# Altium schematic symbol library Resistor - Current Sense.SchLib: 810 symbols (part 4 of 4) (continued)
## WSL2512R0330FEA (continued)
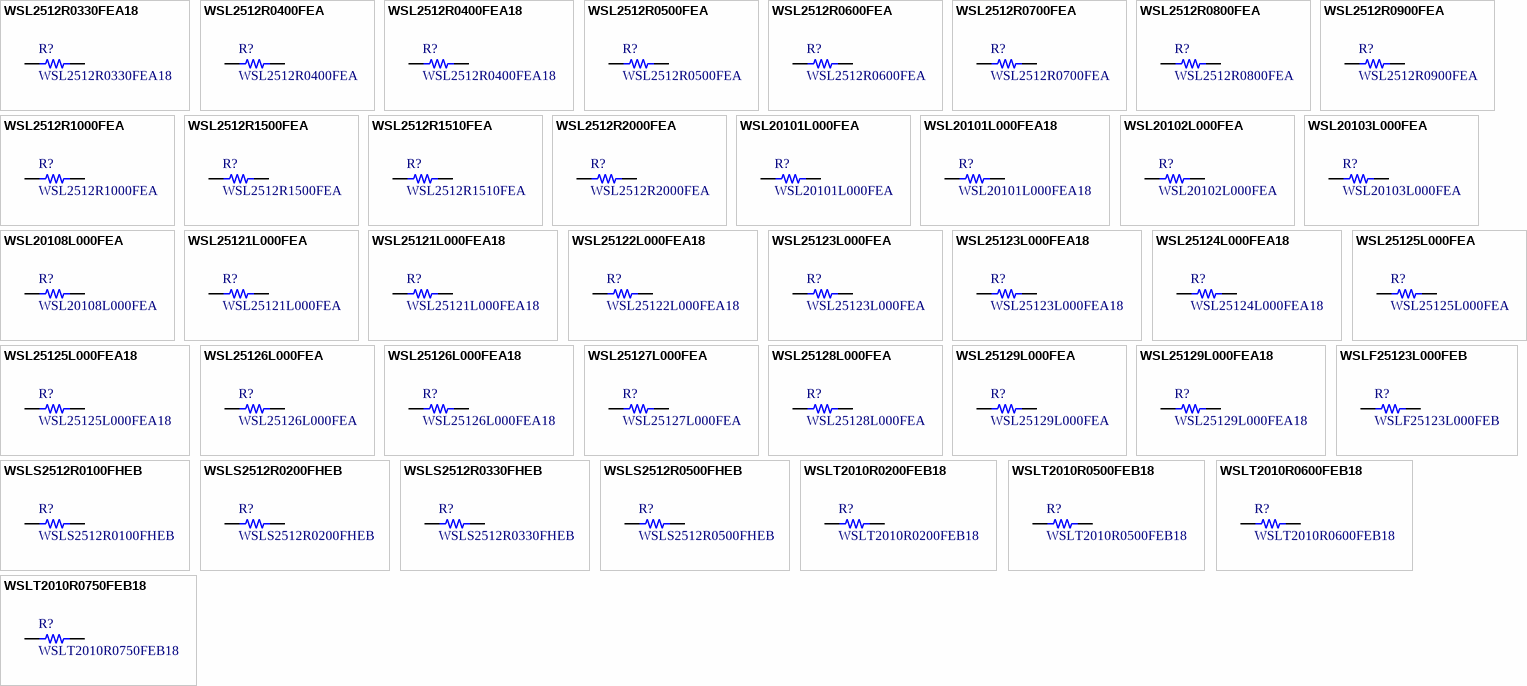
[diagram p19: symbols WSL2512R0330FEA18 to WSLT2010R0750FEB18]

## WSL2512R0330FEA18
designator R?
RES SMD 0.033 OHM 1% 2W 2512; Manufacturer: Vishay Dale; Value: 0.033; TemperatureRange: -65C ~ 170C; TemperatureCoefficient: 75ppm/C; Part Number: WSL2512R0330FEA18; PartId: 21499; Supplier 1: Digi-Key; Supplier Part Number 1: WSLH-.033TR-ND; ComponentLink1Description: Datasheet; ComponentLink1URL: http://www.vishay.com/docs/31057/wslhigh.pdf; ComponentLink2Description: Digi-Key Listing; ComponentLink2URL: https://www.digikey.com/product-detail/en/vishay-dale/WSL2512R0330FEA18/WSLH-.033TR-ND/2695064; Tolerance: 1%; PowerRating: 2W; Price: 0.572; Device Package: 2512 (6432 Metric)
footprint STACKPOLE CSR2512
pins: 1, 2

## WSL2512R0400FEA
designator R?
RES SMD 0.04 OHM 1% 1W 2512; Manufacturer: Vishay Dale; Value: 0.04; TemperatureRange: -65C ~ 170C; TemperatureCoefficient: 75ppm/C; Part Number: WSL2512R0400FEA; PartId: 21478; Supplier 1: Digi-Key; Supplier Part Number 1: WSLG-.04TR-ND; ComponentLink1Description: Datasheet; ComponentLink1URL: http://www.vishay.com/docs/30100/wsl.pdf; ComponentLink2Description: Digi-Key Listing; ComponentLink2URL: https://www.digikey.com/product-detail/en/vishay-dale/WSL2512R0400FEA/WSLG-.04TR-ND/712567; Tolerance: 1%; PowerRating: 1W; Price: 0.442; Device Package: 2512 (6432 Metric)
footprint STACKPOLE CSR2512
pins: 1, 2

## WSL2512R0400FEA18
designator R?
RES SMD 0.04 OHM 1% 2W 2512; Manufacturer: Vishay Dale; Value: 0.04; TemperatureRange: -65C ~ 170C; TemperatureCoefficient: 75ppm/C; Part Number: WSL2512R0400FEA18; PartId: 21496; Supplier 1: Digi-Key; Supplier Part Number 1: WSLH-.04TR-ND; ComponentLink1Description: Datasheet; ComponentLink1URL: http://www.vishay.com/docs/31057/wslhigh.pdf; ComponentLink2Description: Digi-Key Listing; ComponentLink2URL: https://www.digikey.com/product-detail/en/vishay-dale/WSL2512R0400FEA18/WSLH-.04TR-ND/2695066; Tolerance: 1%; PowerRating: 2W; Price: 0.572; Device Package: 2512 (6432 Metric)
footprint STACKPOLE CSR2512
pins: 1, 2

## WSL2512R0500FEA
designator R?
RES SMD 0.05 OHM 1% 1W 2512; Manufacturer: Vishay Dale; Value: 0.05; TemperatureRange: -65C ~ 170C; TemperatureCoefficient: 75ppm/C; Part Number: WSL2512R0500FEA; PartId: 21473; Supplier 1: Digi-Key; Supplier Part Number 1: WSLG-.05TR-ND; ComponentLink1Description: Datasheet; ComponentLink1URL: http://www.vishay.com/docs/30100/wsl.pdf; ComponentLink2Description: Digi-Key Listing; ComponentLink2URL: https://www.digikey.com/product-detail/en/vishay-dale/WSL2512R0500FEA/WSLG-.05TR-ND/712568; Tolerance: 1%; PowerRating: 1W; Price: 0.442; Device Package: 2512 (6432 Metric)
footprint STACKPOLE CSR2512
pins: 1, 2

## WSL2512R0600FEA
designator R?
RES SMD 0.06 OHM 1% 1W 2512; Manufacturer: Vishay Dale; Value: 0.06; TemperatureRange: -65C ~ 170C; TemperatureCoefficient: 75ppm/C; Part Number: WSL2512R0600FEA; PartId: 21476; Supplier 1: Digi-Key; Supplier Part Number 1: WSLG-.06TR-ND; ComponentLink1Description: Datasheet; ComponentLink1URL: http://www.vishay.com/docs/30100/wsl.pdf; ComponentLink2Description: Digi-Key Listing; ComponentLink2URL: https://www.digikey.com/product-detail/en/vishay-dale/WSL2512R0600FEA/WSLG-.06TR-ND/712569; Tolerance: 1%; PowerRating: 1W; Price: 0.442; Device Package: 2512 (6432 Metric)
footprint STACKPOLE CSR2512
pins: 1, 2

## WSL2512R0700FEA
designator R?
RES SMD 0.07 OHM 1% 1W 2512; Manufacturer: Vishay Dale; Value: 0.07; TemperatureRange: -65C ~ 170C; TemperatureCoefficient: 75ppm/C; Part Number: WSL2512R0700FEA; PartId: 21468; Supplier 1: Digi-Key; Supplier Part Number 1: WSLG-.07TR-ND; ComponentLink1Description: Datasheet; ComponentLink1URL: http://www.vishay.com/docs/30100/wsl.pdf; ComponentLink2Description: Digi-Key Listing; ComponentLink2URL: https://www.digikey.com/product-detail/en/vishay-dale/WSL2512R0700FEA/WSLG-.07TR-ND/712570; Tolerance: 1%; PowerRating: 1W; Price: 0.39; Device Package: 2512 (6432 Metric)
footprint STACKPOLE CSR2512
pins: 1, 2

## WSL2512R0800FEA
designator R?
RES SMD 0.08 OHM 1% 1W 2512; Manufacturer: Vishay Dale; Value: 0.08; TemperatureRange: -65C ~ 170C; TemperatureCoefficient: 75ppm/C; Part Number: WSL2512R0800FEA; PartId: 21465; Supplier 1: Digi-Key; Supplier Part Number 1: WSLG-.08TR-ND; ComponentLink1Description: Datasheet; ComponentLink1URL: http://www.vishay.com/docs/30100/wsl.pdf; ComponentLink2Description: Digi-Key Listing; ComponentLink2URL: https://www.digikey.com/product-detail/en/vishay-dale/WSL2512R0800FEA/WSLG-.08TR-ND/712571; Tolerance: 1%; PowerRating: 1W; Price: 0.39; Device Package: 2512 (6432 Metric)
footprint STACKPOLE CSR2512
pins: 1, 2

## WSL2512R0900FEA
designator R?
RES SMD 0.09 OHM 1% 1W 2512; Manufacturer: Vishay Dale; Value: 0.09; TemperatureRange: -65C ~ 170C; TemperatureCoefficient: 75ppm/C; Part Number: WSL2512R0900FEA; PartId: 21466; Supplier 1: Digi-Key; Supplier Part Number 1: WSLG-.09TR-ND; ComponentLink1Description: Datasheet; ComponentLink1URL: http://www.vishay.com/docs/30100/wsl.pdf; ComponentLink2Description: Digi-Key Listing; ComponentLink2URL: https://www.digikey.com/product-detail/en/vishay-dale/WSL2512R0900FEA/WSLG-.09TR-ND/712572; Tolerance: 1%; PowerRating: 1W; Price: 0.39; Device Package: 2512 (6432 Metric)
footprint STACKPOLE CSR2512
pins: 1, 2

## WSL2512R1000FEA
designator R?
RES SMD 0.1 OHM 1% 1W 2512; Manufacturer: Vishay Dale; Value: 0.1; TemperatureRange: -65C ~ 170C; TemperatureCoefficient: 75ppm/C; Part Number: WSL2512R1000FEA; PartId: 21462; Supplier 1: Digi-Key; Supplier Part Number 1: WSLG-.10TR-ND; ComponentLink1Description: Datasheet; ComponentLink1URL: http://www.vishay.com/docs/30100/wsl.pdf; ComponentLink2Description: Digi-Key Listing; ComponentLink2URL: https://www.digikey.com/product-detail/en/vishay-dale/WSL2512R1000FEA/WSLG-.10TR-ND/712573; Tolerance: 1%; PowerRating: 1W; Price: 0.39; Device Package: 2512 (6432 Metric)
footprint STACKPOLE CSR2512
pins: 1, 2

## WSL2512R1500FEA
designator R?
RES SMD 0.15 OHM 1% 1W 2512; Manufacturer: Vishay Dale; Value: 0.15; TemperatureRange: -65C ~ 170C; TemperatureCoefficient: 75ppm/C; Part Number: WSL2512R1500FEA; PartId: 21464; Supplier 1: Digi-Key; Supplier Part Number 1: WSLG-.15TR-ND; ComponentLink1Description: Datasheet; ComponentLink1URL: http://www.vishay.com/docs/30100/wsl.pdf; ComponentLink2Description: Digi-Key Listing; ComponentLink2URL: https://www.digikey.com/product-detail/en/vishay-dale/WSL2512R1500FEA/WSLG-.15TR-ND/712574; Tolerance: 1%; PowerRating: 1W; Price: 0.39; Device Package: 2512 (6432 Metric)
footprint STACKPOLE CSR2512
pins: 1, 2

## WSL2512R1510FEA
designator R?
RES SMD 0.151 OHM 1% 1W 2512; Manufacturer: Vishay Dale; Value: 0.151; TemperatureRange: -65C ~ 170C; TemperatureCoefficient: 75ppm/C; Part Number: WSL2512R1510FEA; PartId: 21452; Supplier 1: Digi-Key; Supplier Part Number 1: WSLG-.151TR-ND; ComponentLink1Description: Datasheet; ComponentLink1URL: http://www.vishay.com/docs/30100/wsl.pdf; ComponentLink2Description: Digi-Key Listing; ComponentLink2URL: https://www.digikey.com/product-detail/en/vishay-dale/WSL2512R1510FEA/WSLG-.151TR-ND/712575; Tolerance: 1%; PowerRating: 1W; Price: 0.2893; Device Package: 2512 (6432 Metric)
footprint STACKPOLE CSR2512
pins: 1, 2

## WSL2512R2000FEA
designator R?
RES SMD 0.2 OHM 1% 1W 2512; Manufacturer: Vishay Dale; Value: 0.2; TemperatureRange: -65C ~ 170C; TemperatureCoefficient: 75ppm/C; Part Number: WSL2512R2000FEA; PartId: 21463; Supplier 1: Digi-Key; Supplier Part Number 1: WSLG-.20TR-ND; ComponentLink1Description: Datasheet; ComponentLink1URL: http://www.vishay.com/docs/30100/wsl.pdf; ComponentLink2Description: Digi-Key Listing; ComponentLink2URL: https://www.digikey.com/product-detail/en/vishay-dale/WSL2512R2000FEA/WSLG-.20TR-ND/712576; Tolerance: 1%; PowerRating: 1W; Price: 0.39; Device Package: 2512 (6432 Metric)
footprint STACKPOLE CSR2512
pins: 1, 2

## WSL20101L000FEA
designator R?
RES SMD 0.001 OHM 1% 1/2W 2010; Manufacturer: Vishay Dale; Value: 0.001; TemperatureRange: -65C ~ 170C; TemperatureCoefficient: 275ppm/C; PowerRating: 0.5W, 1/2W; Part Number: WSL20101L000FEA; PartId: 21606; Supplier 1: Digi-Key; Supplier Part Number 1: WSLE-.001TR-ND; ComponentLink1Description: Datasheet; ComponentLink1URL: http://www.vishay.com/docs/30100/wsl.pdf; ComponentLink2Description: Digi-Key Listing; ComponentLink2URL: https://www.digikey.com/product-detail/en/vishay-dale/WSL20101L000FEA/WSLE-.001TR-ND/712504; Tolerance: 1%; Price: 0.494; Device Package: 2010 (5025 Metric)
footprint STACKPOLE CSR2010
pins: 1, 2

## WSL20101L000FEA18
designator R?
RES SMD 0.001 OHM 1% 1W 2010; Manufacturer: Vishay Dale; Value: 0.001; TemperatureRange: -65C ~ 170C; TemperatureCoefficient: 275ppm/C; Part Number: WSL20101L000FEA18; PartId: 21610; Supplier 1: Digi-Key; Supplier Part Number 1: WSLF-.001TR-ND; ComponentLink1Description: Datasheet; ComponentLink1URL: http://www.vishay.com/docs/31057/wslhigh.pdf; ComponentLink2Description: Digi-Key Listing; ComponentLink2URL: https://www.digikey.com/product-detail/en/vishay-dale/WSL20101L000FEA18/WSLF-.001TR-ND/712505; Tolerance: 1%; PowerRating: 1W; Price: 0.6435; Device Package: 2010 (5025 Metric)
footprint STACKPOLE CSR2010
pins: 1, 2

## WSL20102L000FEA
designator R?
RES SMD 0.002 OHM 1% 1/2W 2010; Manufacturer: Vishay Dale; Value: 0.002; TemperatureRange: -65C ~ 170C; TemperatureCoefficient: 275ppm/C; PowerRating: 0.5W, 1/2W; Part Number: WSL20102L000FEA; PartId: 21607; Supplier 1: Digi-Key; Supplier Part Number 1: WSLE-.002TR-ND; ComponentLink1Description: Datasheet; ComponentLink1URL: http://www.vishay.com/docs/30100/wsl.pdf; ComponentLink2Description: Digi-Key Listing; ComponentLink2URL: https://www.digikey.com/product-detail/en/vishay-dale/WSL20102L000FEA/WSLE-.002TR-ND/712506; Tolerance: 1%; Price: 0.494; Device Package: 2010 (5025 Metric)
footprint STACKPOLE CSR2010
pins: 1, 2

## WSL20103L000FEA
designator R?
RES SMD 0.003 OHM 1% 1/2W 2010; Manufacturer: Vishay Dale; Value: 0.003; TemperatureRange: -65C ~ 170C; TemperatureCoefficient: 150ppm/C; PowerRating: 0.5W, 1/2W; Part Number: WSL20103L000FEA; PartId: 21608; Supplier 1: Digi-Key; Supplier Part Number 1: WSLE-.003TR-ND; ComponentLink1Description: Datasheet; ComponentLink1URL: http://www.vishay.com/docs/30100/wsl.pdf; ComponentLink2Description: Digi-Key Listing; ComponentLink2URL: https://www.digikey.com/product-detail/en/vishay-dale/WSL20103L000FEA/WSLE-.003TR-ND/712507; Tolerance: 1%; Price: 0.494; Device Package: 2010 (5025 Metric)
footprint STACKPOLE CSR2010
pins: 1, 2

## WSL20108L000FEA
designator R?
RES SMD 0.008 OHM 1% 1/2W 2010; Manufacturer: Vishay Dale; Value: 0.008; TemperatureRange: -65C ~ 170C; TemperatureCoefficient: 75ppm/C; PowerRating: 0.5W, 1/2W; Part Number: WSL20108L000FEA; PartId: 21605; Supplier 1: Digi-Key; Supplier Part Number 1: WSLE-.008TR-ND; ComponentLink1Description: Datasheet; ComponentLink1URL: http://www.vishay.com/docs/30100/wsl.pdf; ComponentLink2Description: Digi-Key Listing; ComponentLink2URL: https://www.digikey.com/product-detail/en/vishay-dale/WSL20108L000FEA/WSLE-.008TR-ND/712514; Tolerance: 1%; Price: 0.468; Device Package: 2010 (5025 Metric)
footprint STACKPOLE CSR2010
pins: 1, 2

## WSL25121L000FEA
designator R?
RES SMD 0.001 OHM 1% 1W 2512; Manufacturer: Vishay Dale; Value: 0.001; TemperatureRange: -65C ~ 170C; TemperatureCoefficient: 275ppm/C; Part Number: WSL25121L000FEA; PartId: 21510; Supplier 1: Digi-Key; Supplier Part Number 1: WSLG-.001TR-ND; ComponentLink1Description: Datasheet; ComponentLink1URL: http://www.vishay.com/docs/30100/wsl.pdf; ComponentLink2Description: Digi-Key Listing; ComponentLink2URL: https://www.digikey.com/product-detail/en/vishay-dale/WSL25121L000FEA/WSLG-.001TR-ND/712551; Tolerance: 1%; PowerRating: 1W; Price: 0.663; Device Package: 2512 (6432 Metric)
footprint STACKPOLE CSR2512
pins: 1, 2

## WSL25121L000FEA18
designator R?
RES SMD 0.001 OHM 1% 2W 2512; Manufacturer: Vishay Dale; Value: 0.001; TemperatureRange: -65C ~ 170C; TemperatureCoefficient: 275ppm/C; Part Number: WSL25121L000FEA18; PartId: 21517; Supplier 1: Digi-Key; Supplier Part Number 1: WSLH-.001TR-ND; ComponentLink1Description: Datasheet; ComponentLink1URL: http://www.vishay.com/docs/31057/wslhigh.pdf; ComponentLink2Description: Digi-Key Listing; ComponentLink2URL: https://www.digikey.com/product-detail/en/vishay-dale/WSL25121L000FEA18/WSLH-.001TR-ND/2695039; Tolerance: 1%; PowerRating: 2W; Price: 0.8606; Device Package: 2512 (6432 Metric)
footprint STACKPOLE CSR2512
pins: 1, 2

## WSL25122L000FEA18
designator R?
RES SMD 0.002 OHM 1% 2W 2512; Manufacturer: Vishay Dale; Value: 0.002; TemperatureRange: -65C ~ 170C; TemperatureCoefficient: 275ppm/C; Part Number: WSL25122L000FEA18; PartId: 21514; Supplier 1: Digi-Key; Supplier Part Number 1: WSLH-.002TR-ND; ComponentLink1Description: Datasheet; ComponentLink1URL: http://www.vishay.com/docs/31057/wslhigh.pdf; ComponentLink2Description: Digi-Key Listing; ComponentLink2URL: https://www.digikey.com/product-detail/en/vishay-dale/WSL25122L000FEA18/WSLH-.002TR-ND/2695040; Tolerance: 1%; PowerRating: 2W; Price: 0.8606; Device Package: 2512 (6432 Metric)
footprint STACKPOLE CSR2512
pins: 1, 2

## WSL25123L000FEA
designator R?
RES SMD 0.003 OHM 1% 1W 2512; Manufacturer: Vishay Dale; Value: 0.003; TemperatureRange: -65C ~ 170C; TemperatureCoefficient: 150ppm/C; Part Number: WSL25123L000FEA; PartId: 21509; Supplier 1: Digi-Key; Supplier Part Number 1: WSLG-.003TR-ND; ComponentLink1Description: Datasheet; ComponentLink1URL: http://www.vishay.com/docs/30100/wsl.pdf; ComponentLink2Description: Digi-Key Listing; ComponentLink2URL: https://www.digikey.com/product-detail/en/vishay-dale/WSL25123L000FEA/WSLG-.003TR-ND/712553; Tolerance: 1%; PowerRating: 1W; Price: 0.663; Device Package: 2512 (6432 Metric)
footprint STACKPOLE CSR2512
pins: 1, 2

## WSL25123L000FEA18
designator R?
RES SMD 0.003 OHM 1% 2W 2512; Manufacturer: Vishay Dale; Value: 0.003; TemperatureRange: -65C ~ 170C; TemperatureCoefficient: 150ppm/C; Part Number: WSL25123L000FEA18; PartId: 21515; Supplier 1: Digi-Key; Supplier Part Number 1: WSLH-.003TR-ND; ComponentLink1Description: Datasheet; ComponentLink1URL: http://www.vishay.com/docs/31057/wslhigh.pdf; ComponentLink2Description: Digi-Key Listing; ComponentLink2URL: https://www.digikey.com/product-detail/en/vishay-dale/WSL25123L000FEA18/WSLH-.003TR-ND/2695041; Tolerance: 1%; PowerRating: 2W; Price: 0.8606; Device Package: 2512 (6432 Metric)
footprint STACKPOLE CSR2512
pins: 1, 2

## WSL25124L000FEA18
designator R?
RES SMD 0.004 OHM 1% 2W 2512; Manufacturer: Vishay Dale; Value: 0.004; TemperatureRange: -65C ~ 170C; TemperatureCoefficient: 150ppm/C; Part Number: WSL25124L000FEA18; PartId: 21516; Supplier 1: Digi-Key; Supplier Part Number 1: WSLH-.004TR-ND; ComponentLink1Description: Datasheet; ComponentLink1URL: http://www.vishay.com/docs/31057/wslhigh.pdf; ComponentLink2Description: Digi-Key Listing; ComponentLink2URL: https://www.digikey.com/product-detail/en/vishay-dale/WSL25124L000FEA18/WSLH-.004TR-ND/2695042; Tolerance: 1%; PowerRating: 2W; Price: 0.8606; Device Package: 2512 (6432 Metric)
footprint STACKPOLE CSR2512
pins: 1, 2

## WSL25125L000FEA
designator R?
RES SMD 0.005 OHM 1% 1W 2512; Manufacturer: Vishay Dale; Value: 0.005; TemperatureRange: -65C ~ 170C; TemperatureCoefficient: 110ppm/C; Part Number: WSL25125L000FEA; PartId: 21501; Supplier 1: Digi-Key; Supplier Part Number 1: WSLG-.005TR-ND; ComponentLink1Description: Datasheet; ComponentLink1URL: http://www.vishay.com/docs/30100/wsl.pdf; ComponentLink2Description: Digi-Key Listing; ComponentLink2URL: https://www.digikey.com/product-detail/en/vishay-dale/WSL25125L000FEA/WSLG-.005TR-ND/712555; Tolerance: 1%; PowerRating: 1W; Price: 0.6375; Device Package: 2512 (6432 Metric)
footprint STACKPOLE CSR2512
pins: 1, 2

## WSL25125L000FEA18
designator R?
RES SMD 0.005 OHM 1% 2W 2512; Manufacturer: Vishay Dale; Value: 0.005; TemperatureRange: -65C ~ 170C; TemperatureCoefficient: 110ppm/C; Part Number: WSL25125L000FEA18; PartId: 21512; Supplier 1: Digi-Key; Supplier Part Number 1: WSLH-.005TR-ND; ComponentLink1Description: Datasheet; ComponentLink1URL: http://www.vishay.com/docs/31057/wslhigh.pdf; ComponentLink2Description: Digi-Key Listing; ComponentLink2URL: https://www.digikey.com/product-detail/en/vishay-dale/WSL25125L000FEA18/WSLH-.005TR-ND/2695043; Tolerance: 1%; PowerRating: 2W; Price: 0.8287; Device Package: 2512 (6432 Metric)
footprint STACKPOLE CSR2512
pins: 1, 2

## WSL25126L000FEA
designator R?
RES SMD 0.006 OHM 1% 1W 2512; Manufacturer: Vishay Dale; Value: 0.006; TemperatureRange: -65C ~ 170C; TemperatureCoefficient: 110ppm/C; Part Number: WSL25126L000FEA; PartId: 21500; Supplier 1: Digi-Key; Supplier Part Number 1: WSLG-.006TR-ND; ComponentLink1Description: Datasheet; ComponentLink1URL: http://www.vishay.com/docs/30100/wsl.pdf; ComponentLink2Description: Digi-Key Listing; ComponentLink2URL: https://www.digikey.com/product-detail/en/vishay-dale/WSL25126L000FEA/WSLG-.006TR-ND/712556; Tolerance: 1%; PowerRating: 1W; Price: 0.6375; Device Package: 2512 (6432 Metric)
footprint STACKPOLE CSR2512
pins: 1, 2

## WSL25126L000FEA18
designator R?
RES SMD 0.006 OHM 1% 2W 2512; Manufacturer: Vishay Dale; Value: 0.006; TemperatureRange: -65C ~ 170C; TemperatureCoefficient: 110ppm/C; Part Number: WSL25126L000FEA18; PartId: 21513; Supplier 1: Digi-Key; Supplier Part Number 1: WSLH-.006TR-ND; ComponentLink1Description: Datasheet; ComponentLink1URL: http://www.vishay.com/docs/31057/wslhigh.pdf; ComponentLink2Description: Digi-Key Listing; ComponentLink2URL: https://www.digikey.com/product-detail/en/vishay-dale/WSL25126L000FEA18/WSLH-.006TR-ND/2695044; Tolerance: 1%; PowerRating: 2W; Price: 0.8287; Device Package: 2512 (6432 Metric)
footprint STACKPOLE CSR2512
pins: 1, 2

## WSL25127L000FEA
designator R?
RES SMD 0.007 OHM 1% 1W 2512; Manufacturer: Vishay Dale; Value: 0.007; TemperatureRange: -65C ~ 170C; TemperatureCoefficient: 75ppm/C; Part Number: WSL25127L000FEA; PartId: 21502; Supplier 1: Digi-Key; Supplier Part Number 1: WSLG-.007TR-ND; ComponentLink1Description: Datasheet; ComponentLink1URL: http://www.vishay.com/docs/30100/wsl.pdf; ComponentLink2Description: Digi-Key Listing; ComponentLink2URL: https://www.digikey.com/product-detail/en/vishay-dale/WSL25127L000FEA/WSLG-.007TR-ND/712557; Tolerance: 1%; PowerRating: 1W; Price: 0.6375; Device Package: 2512 (6432 Metric)
footprint STACKPOLE CSR2512
pins: 1, 2

## WSL25128L000FEA
designator R?
RES SMD 0.008 OHM 1% 1W 2512; Manufacturer: Vishay Dale; Value: 0.008; TemperatureRange: -65C ~ 170C; TemperatureCoefficient: 75ppm/C; Part Number: WSL25128L000FEA; PartId: 21504; Supplier 1: Digi-Key; Supplier Part Number 1: WSLG-.008TR-ND; ComponentLink1Description: Datasheet; ComponentLink1URL: http://www.vishay.com/docs/30100/wsl.pdf; ComponentLink2Description: Digi-Key Listing; ComponentLink2URL: https://www.digikey.com/product-detail/en/vishay-dale/WSL25128L000FEA/WSLG-.008TR-ND/712558; Tolerance: 1%; PowerRating: 1W; Price: 0.6375; Device Package: 2512 (6432 Metric)
footprint STACKPOLE CSR2512
pins: 1, 2

## WSL25129L000FEA
designator R?
RES SMD 0.009 OHM 1% 1W 2512; Manufacturer: Vishay Dale; Value: 0.009; TemperatureRange: -65C ~ 170C; TemperatureCoefficient: 75ppm/C; Part Number: WSL25129L000FEA; PartId: 21503; Supplier 1: Digi-Key; Supplier Part Number 1: WSLG-.009TR-ND; ComponentLink1Description: Datasheet; ComponentLink1URL: http://www.vishay.com/docs/30100/wsl.pdf; ComponentLink2Description: Digi-Key Listing; ComponentLink2URL: https://www.digikey.com/product-detail/en/vishay-dale/WSL25129L000FEA/WSLG-.009TR-ND/712559; Tolerance: 1%; PowerRating: 1W; Price: 0.6375; Device Package: 2512 (6432 Metric)
footprint STACKPOLE CSR2512
pins: 1, 2

## WSL25129L000FEA18
designator R?
RES SMD 0.009 OHM 1% 2W 2512; Manufacturer: Vishay Dale; Value: 0.009; TemperatureRange: -65C ~ 170C; TemperatureCoefficient: 75ppm/C; Part Number: WSL25129L000FEA18; PartId: 21511; Supplier 1: Digi-Key; Supplier Part Number 1: WSLH-.009TR-ND; ComponentLink1Description: Datasheet; ComponentLink1URL: http://www.vishay.com/docs/31057/wslhigh.pdf; ComponentLink2Description: Digi-Key Listing; ComponentLink2URL: https://www.digikey.com/product-detail/en/vishay-dale/WSL25129L000FEA18/WSLH-.009TR-ND/712560; Tolerance: 1%; PowerRating: 2W; Price: 0.8287; Device Package: 2512 (6432 Metric)
footprint STACKPOLE CSR2512
pins: 1, 2

## WSLF25123L000FEB
designator R?
RES SMD 0.003 OHM 1% 4W 2512; Manufacturer: Vishay Dale; Value: 0.003; TemperatureRange: -65C ~ 170C; TemperatureCoefficient: 70ppm/C; Part Number: WSLF25123L000FEB; PartId: 21446; Supplier 1: Digi-Key; Supplier Part Number 1: 541-3132-2-ND; ComponentLink1Description: Datasheet; ComponentLink1URL: http://www.vishay.com/docs/30193/wslf.pdf; ComponentLink2Description: Digi-Key Listing; ComponentLink2URL: https://www.digikey.com/product-detail/en/vishay-dale/WSLF25123L000FEB/541-3132-2-ND/6194695; Tolerance: 1%; PowerRating: 4W; Price: 0.2835; Device Package: 2512 (6432 Metric)
footprint STACKPOLE CSR2512
pins: 1, 2

## WSLS2512R0100FHEB
designator R?
RES SMD 0.01 OHM 1% 1W 2512; Manufacturer: Vishay Dale; Value: 0.01; TemperatureRange: -65C ~ 170C; TemperatureCoefficient: 75ppm/C; Part Number: WSLS2512R0100FHEB; PartId: 21505; Supplier 1: Digi-Key; Supplier Part Number 1: WSLSA-.010TR-ND; ComponentLink1Description: Datasheet; ComponentLink1URL: http://www.vishay.com/docs/30123/wsls2512.pdf; ComponentLink2Description: Digi-Key Listing; ComponentLink2URL: https://www.digikey.com/product-detail/en/vishay-dale/WSLS2512R0100FHEB/WSLSA-.010TR-ND/2695182; Tolerance: 1%; PowerRating: 1W; Price: 0.65; Device Package: 2512 (6432 Metric)
footprint STACKPOLE CSR2512
pins: 1, 2

## WSLS2512R0200FHEB
designator R?
RES SMD 0.02 OHM 1% 1W 2512; Manufacturer: Vishay Dale; Value: 0.02; TemperatureRange: -65C ~ 170C; TemperatureCoefficient: 75ppm/C; Part Number: WSLS2512R0200FHEB; PartId: 21508; Supplier 1: Digi-Key; Supplier Part Number 1: WSLSA-.020TR-ND; ComponentLink1Description: Datasheet; ComponentLink1URL: http://www.vishay.com/docs/30123/wsls2512.pdf; ComponentLink2Description: Digi-Key Listing; ComponentLink2URL: https://www.digikey.com/product-detail/en/vishay-dale/WSLS2512R0200FHEB/WSLSA-.020TR-ND/2695184; Tolerance: 1%; PowerRating: 1W; Price: 0.65; Device Package: 2512 (6432 Metric)
footprint STACKPOLE CSR2512
pins: 1, 2

## WSLS2512R0330FHEB
designator R?
RES SMD 0.033 OHM 1% 1W 2512; Manufacturer: Vishay Dale; Value: 0.033; TemperatureRange: -65C ~ 170C; TemperatureCoefficient: 75ppm/C; Part Number: WSLS2512R0330FHEB; PartId: 21507; Supplier 1: Digi-Key; Supplier Part Number 1: WSLSA-.033TR-ND; ComponentLink1Description: Datasheet; ComponentLink1URL: http://www.vishay.com/docs/30123/wsls2512.pdf; ComponentLink2Description: Digi-Key Listing; ComponentLink2URL: https://www.digikey.com/product-detail/en/vishay-dale/WSLS2512R0330FHEB/WSLSA-.033TR-ND/2695185; Tolerance: 1%; PowerRating: 1W; Price: 0.65; Device Package: 2512 (6432 Metric)
footprint STACKPOLE CSR2512
pins: 1, 2

## WSLS2512R0500FHEB
designator R?
RES SMD 0.05 OHM 1% 1W 2512; Manufacturer: Vishay Dale; Value: 0.05; TemperatureRange: -65C ~ 170C; TemperatureCoefficient: 75ppm/C; Part Number: WSLS2512R0500FHEB; PartId: 21506; Supplier 1: Digi-Key; Supplier Part Number 1: WSLSA-.050TR-ND; ComponentLink1Description: Datasheet; ComponentLink1URL: http://www.vishay.com/docs/30123/wsls2512.pdf; ComponentLink2Description: Digi-Key Listing; ComponentLink2URL: https://www.digikey.com/product-detail/en/vishay-dale/WSLS2512R0500FHEB/WSLSA-.050TR-ND/2695187; Tolerance: 1%; PowerRating: 1W; Price: 0.65; Device Package: 2512 (6432 Metric)
footprint STACKPOLE CSR2512
pins: 1, 2

## WSLT2010R0200FEB18
designator R?
RES SMD 0.02 OHM 1% 1W 2010; Manufacturer: Vishay Dale; Value: 0.02; TemperatureRange: -65C ~ 275C; TemperatureCoefficient: 75ppm/C; Part Number: WSLT2010R0200FEB18; PartId: 21585; Supplier 1: Digi-Key; Supplier Part Number 1: WSLTA-.020TR-ND; ComponentLink1Description: Datasheet; ComponentLink1URL: http://www.vishay.com/docs/30138/wslt2010.pdf; ComponentLink2Description: Digi-Key Listing; ComponentLink2URL: https://www.digikey.com/product-detail/en/vishay-dale/WSLT2010R0200FEB18/WSLTA-.020TR-ND/2695141; Tolerance: 1%; PowerRating: 1W; Price: 0.3591; Device Package: 2010 (5025 Metric)
footprint STACKPOLE CSR2010
pins: 1, 2

## WSLT2010R0500FEB18
designator R?
RES SMD 0.05 OHM 1% 1W 2010; Manufacturer: Vishay Dale; Value: 0.05; TemperatureRange: -65C ~ 275C; TemperatureCoefficient: 75ppm/C; Part Number: WSLT2010R0500FEB18; PartId: 21586; Supplier 1: Digi-Key; Supplier Part Number 1: WSLTA-.050TR-ND; ComponentLink1Description: Datasheet; ComponentLink1URL: http://www.vishay.com/docs/30138/wslt2010.pdf; ComponentLink2Description: Digi-Key Listing; ComponentLink2URL: https://www.digikey.com/product-detail/en/vishay-dale/WSLT2010R0500FEB18/WSLTA-.050TR-ND/2695145; Tolerance: 1%; PowerRating: 1W; Price: 0.3591; Device Package: 2010 (5025 Metric)
footprint STACKPOLE CSR2010
pins: 1, 2

## WSLT2010R0600FEB18
designator R?
RES SMD 0.06 OHM 1% 1W 2010; Manufacturer: Vishay Dale; Value: 0.06; TemperatureRange: -65C ~ 275C; TemperatureCoefficient: 75ppm/C; Part Number: WSLT2010R0600FEB18; PartId: 21584; Supplier 1: Digi-Key; Supplier Part Number 1: WSLTA-.060TR-ND; ComponentLink1Description: Datasheet; ComponentLink1URL: http://www.vishay.com/docs/30138/wslt2010.pdf; ComponentLink2Description: Digi-Key Listing; ComponentLink2URL: https://www.digikey.com/product-detail/en/vishay-dale/WSLT2010R0600FEB18/WSLTA-.060TR-ND/2695146; Tolerance: 1%; PowerRating: 1W; Price: 0.3591; Device Package: 2010 (5025 Metric)
footprint STACKPOLE CSR2010
pins: 1, 2

## WSLT2010R0750FEB18
designator R?
RES SMD 0.075 OHM 1% 1W 2010; Manufacturer: Vishay Dale; Value: 0.075; TemperatureRange: -65C ~ 275C; TemperatureCoefficient: 75ppm/C; Part Number: WSLT2010R0750FEB18; PartId: 21578; Supplier 1: Digi-Key; Supplier Part Number 1: WSLTA-.075TR-ND; ComponentLink1Description: Datasheet; ComponentLink1URL: http://www.vishay.com/docs/30138/wslt2010.pdf; ComponentLink2Description: Digi-Key Listing; ComponentLink2URL: https://www.digikey.com/product-detail/en/vishay-dale/WSLT2010R0750FEB18/WSLTA-.075TR-ND/2695147; Tolerance: 1%; PowerRating: 1W; Price: 0.3307; Device Package: 2010 (5025 Metric)
footprint STACKPOLE CSR2010
pins: 1, 2

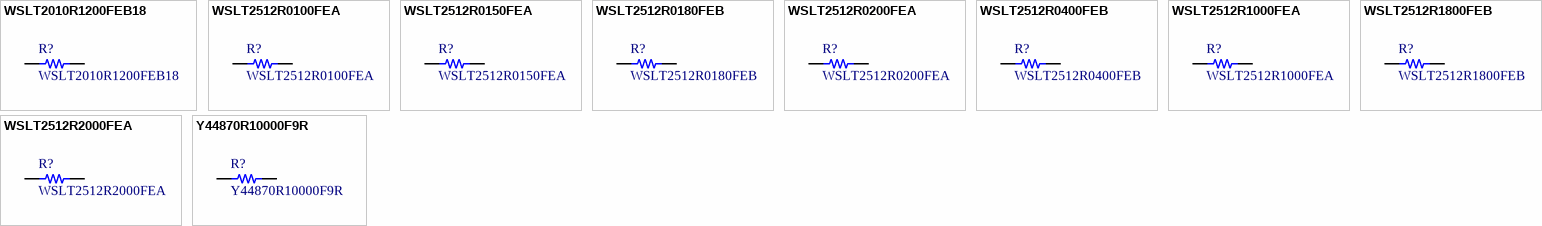
[diagram p20: symbols WSLT2010R1200FEB18 to Y44870R10000F9R]

## WSLT2010R1200FEB18
designator R?
RES SMD 0.12 OHM 1% 1W 2010; Manufacturer: Vishay Dale; Value: 0.12; TemperatureRange: -65C ~ 275C; TemperatureCoefficient: 75ppm/C; Part Number: WSLT2010R1200FEB18; PartId: 21579; Supplier 1: Digi-Key; Supplier Part Number 1: WSLTA-.120TR-ND; ComponentLink1Description: Datasheet; ComponentLink1URL: http://www.vishay.com/docs/30138/wslt2010.pdf; ComponentLink2Description: Digi-Key Listing; ComponentLink2URL: https://www.digikey.com/product-detail/en/vishay-dale/WSLT2010R1200FEB18/WSLTA-.120TR-ND/2695149; Tolerance: 1%; PowerRating: 1W; Price: 0.3307; Device Package: 2010 (5025 Metric)
footprint STACKPOLE CSR2010
pins: 1, 2

## WSLT2512R0100FEA
designator R?
RES SMD 0.01 OHM 1% 1W 2512; Manufacturer: Vishay Dale; Value: 0.01; TemperatureRange: -65C ~ 275C; TemperatureCoefficient: 75ppm/C; Part Number: WSLT2512R0100FEA; PartId: 21457; Supplier 1: Digi-Key; Supplier Part Number 1: WSLT-.01TR-ND; ComponentLink1Description: Datasheet; ComponentLink1URL: http://www.vishay.com/docs/30121/wslt2512.pdf; ComponentLink2Description: Digi-Key Listing; ComponentLink2URL: https://www.digikey.com/product-detail/en/vishay-dale/WSLT2512R0100FEA/WSLT-.01TR-ND/1883284; Tolerance: 1%; PowerRating: 1W; Price: 0.351; Device Package: 2512 (6432 Metric)
footprint STACKPOLE CSR2512
pins: 1, 2

## WSLT2512R0150FEA
designator R?
RES SMD 0.015 OHM 1% 1W 2512; Manufacturer: Vishay Dale; Value: 0.015; TemperatureRange: -65C ~ 275C; TemperatureCoefficient: 75ppm/C; Part Number: WSLT2512R0150FEA; PartId: 21459; Supplier 1: Digi-Key; Supplier Part Number 1: WSLT-.015TR-ND; ComponentLink1Description: Datasheet; ComponentLink1URL: http://www.vishay.com/docs/30121/wslt2512.pdf; ComponentLink2Description: Digi-Key Listing; ComponentLink2URL: https://www.digikey.com/product-detail/en/vishay-dale/WSLT2512R0150FEA/WSLT-.015TR-ND/1883285; Tolerance: 1%; PowerRating: 1W; Price: 0.351; Device Package: 2512 (6432 Metric)
footprint STACKPOLE CSR2512
pins: 1, 2

## WSLT2512R0180FEB
designator R?
RES SMD 0.018 OHM 1% 1W 2512; Manufacturer: Vishay Dale; Value: 0.018; TemperatureRange: -65C ~ 275C; TemperatureCoefficient: 75ppm/C; Part Number: WSLT2512R0180FEB; PartId: 21460; Supplier 1: Digi-Key; Supplier Part Number 1: WSLTB-.018TR-ND; ComponentLink1Description: Datasheet; ComponentLink1URL: http://www.vishay.com/docs/30121/wslt2512.pdf; ComponentLink2Description: Digi-Key Listing; ComponentLink2URL: https://www.digikey.com/product-detail/en/vishay-dale/WSLT2512R0180FEB/WSLTB-.018TR-ND/2695160; Tolerance: 1%; PowerRating: 1W; Price: 0.3591; Device Package: 2512 (6432 Metric)
footprint STACKPOLE CSR2512
pins: 1, 2

## WSLT2512R0200FEA
designator R?
RES SMD 0.02 OHM 1% 1W 2512; Manufacturer: Vishay Dale; Value: 0.02; TemperatureRange: -65C ~ 275C; TemperatureCoefficient: 75ppm/C; Part Number: WSLT2512R0200FEA; PartId: 21458; Supplier 1: Digi-Key; Supplier Part Number 1: WSLT-.02TR-ND; ComponentLink1Description: Datasheet; ComponentLink1URL: http://www.vishay.com/docs/30121/wslt2512.pdf; ComponentLink2Description: Digi-Key Listing; ComponentLink2URL: https://www.digikey.com/product-detail/en/vishay-dale/WSLT2512R0200FEA/WSLT-.02TR-ND/1883286; Tolerance: 1%; PowerRating: 1W; Price: 0.351; Device Package: 2512 (6432 Metric)
footprint STACKPOLE CSR2512
pins: 1, 2

## WSLT2512R0400FEB
designator R?
RES SMD 0.04 OHM 1% 1W 2512; Manufacturer: Vishay Dale; Value: 0.04; TemperatureRange: -65C ~ 275C; TemperatureCoefficient: 75ppm/C; Part Number: WSLT2512R0400FEB; PartId: 21461; Supplier 1: Digi-Key; Supplier Part Number 1: WSLTB-.040TR-ND; ComponentLink1Description: Datasheet; ComponentLink1URL: http://www.vishay.com/docs/30121/wslt2512.pdf; ComponentLink2Description: Digi-Key Listing; ComponentLink2URL: https://www.digikey.com/product-detail/en/vishay-dale/WSLT2512R0400FEB/WSLTB-.040TR-ND/2695161; Tolerance: 1%; PowerRating: 1W; Price: 0.3591; Device Package: 2512 (6432 Metric)
footprint STACKPOLE CSR2512
pins: 1, 2

## WSLT2512R1000FEA
designator R?
RES SMD 0.1 OHM 1% 1W 2512; Manufacturer: Vishay Dale; Value: 0.1; TemperatureRange: -65C ~ 275C; TemperatureCoefficient: 75ppm/C; Part Number: WSLT2512R1000FEA; PartId: 21453; Supplier 1: Digi-Key; Supplier Part Number 1: WSLT-.1TR-ND; ComponentLink1Description: Datasheet; ComponentLink1URL: http://www.vishay.com/docs/30121/wslt2512.pdf; ComponentLink2Description: Digi-Key Listing; ComponentLink2URL: https://www.digikey.com/product-detail/en/vishay-dale/WSLT2512R1000FEA/WSLT-.1TR-ND/1883288; Tolerance: 1%; PowerRating: 1W; Price: 0.3221; Device Package: 2512 (6432 Metric)
footprint STACKPOLE CSR2512
pins: 1, 2

## WSLT2512R1800FEB
designator R?
RES SMD 0.18 OHM 1% 1W 2512; Manufacturer: Vishay Dale; Value: 0.18; TemperatureRange: -65C ~ 275C; TemperatureCoefficient: 75ppm/C; Part Number: WSLT2512R1800FEB; PartId: 21456; Supplier 1: Digi-Key; Supplier Part Number 1: WSLTB-.180TR-ND; ComponentLink1Description: Datasheet; ComponentLink1URL: http://www.vishay.com/docs/30121/wslt2512.pdf; ComponentLink2Description: Digi-Key Listing; ComponentLink2URL: https://www.digikey.com/product-detail/en/vishay-dale/WSLT2512R1800FEB/WSLTB-.180TR-ND/2695167; Tolerance: 1%; PowerRating: 1W; Price: 0.3307; Device Package: 2512 (6432 Metric)
footprint STACKPOLE CSR2512
pins: 1, 2

## WSLT2512R2000FEA
designator R?
RES SMD 0.2 OHM 1% 1W 2512; Manufacturer: Vishay Dale; Value: 0.2; TemperatureRange: -65C ~ 275C; TemperatureCoefficient: 75ppm/C; Part Number: WSLT2512R2000FEA; PartId: 21454; Supplier 1: Digi-Key; Supplier Part Number 1: WSLT-.2TR-ND; ComponentLink1Description: Datasheet; ComponentLink1URL: http://www.vishay.com/docs/30121/wslt2512.pdf; ComponentLink2Description: Digi-Key Listing; ComponentLink2URL: https://www.digikey.com/product-detail/en/vishay-dale/WSLT2512R2000FEA/WSLT-.2TR-ND/1883289; Tolerance: 1%; PowerRating: 1W; Price: 0.3221; Device Package: 2512 (6432 Metric)
footprint STACKPOLE CSR2512
pins: 1, 2

## Y44870R10000F9R
designator R?
RES SMD 0.1 OHM 1% 1W 2512; Manufacturer: Vishay Foil Resistors (Division of Vishay Precision Group); Value: 0.1; TemperatureRange: -65C ~ 170C; TemperatureCoefficient: 15ppm/C; Part Number: Y44870R10000F9R; PartId: 21518; Supplier 1: Digi-Key; Supplier Part Number 1: Y4487-.1ATR-ND; ComponentLink1Description: Datasheet; ComponentLink1URL: http://www.vishaypg.com/docs/63145/csm2512s.pdf; ComponentLink2Description: Digi-Key Listing; ComponentLink2URL: https://www.digikey.com/product-detail/en/vishay-foil-resistors-division-of-vishay-precision-group/Y44870R10000F9R/Y4487-.1ATR-ND/2609909; Tolerance: 1%; PowerRating: 1W; Price: 9.61; Device Package: 2512 (6432 Metric)
footprint STACKPOLE CSR2512
pins: 1, 2